# Altium footprint library NXP_60_26022015.PCBLIB: 287 footprints (part 6 of 18)
Each footprint in its own frame and in the unit in brackets; x right, y up, seen from the top. Pads: shape width x height; smd on the part's side, far side on the other; paste and mask are expansions set on the pad; w line width, h text height; cw(c..) or ccw(c..) is an arc to the next point about the centre after c.
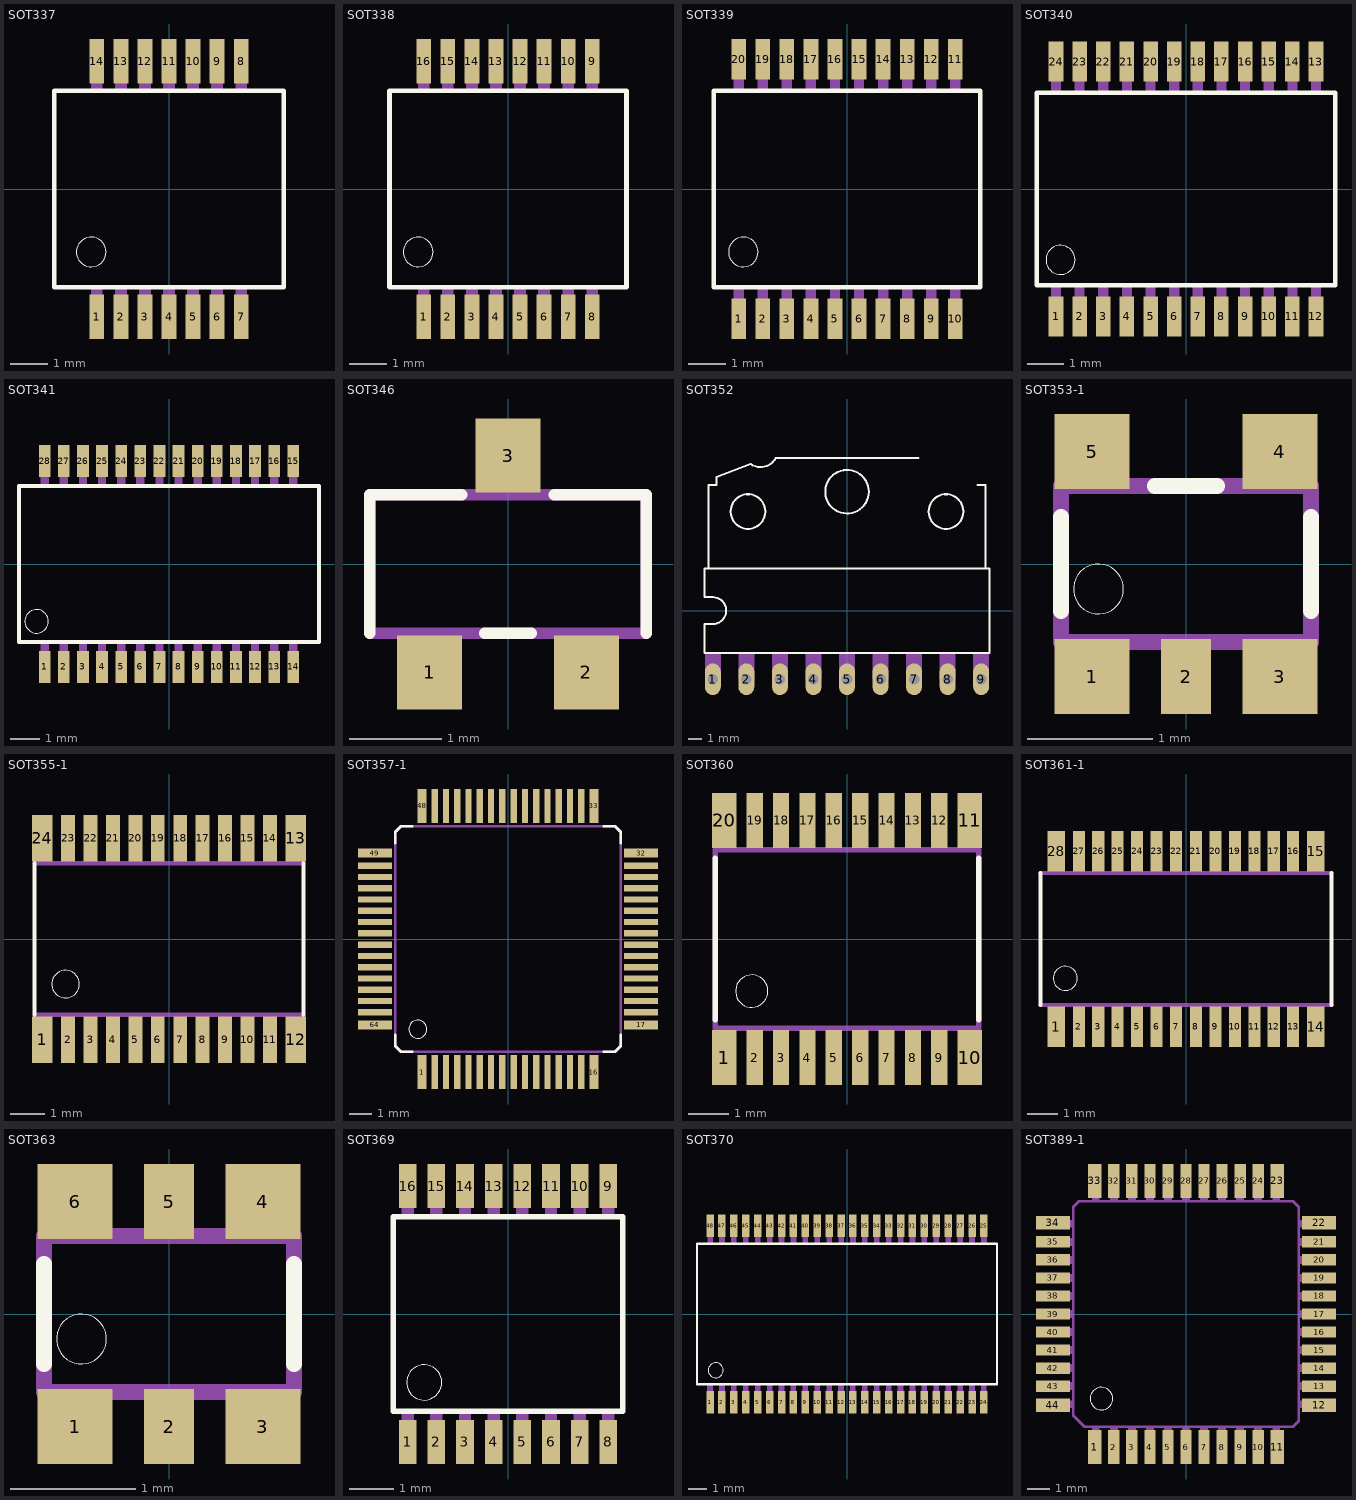
[diagram p5: the footprints below, top view; thin cyan lines are the x and y axes]

## SOT337 [mm]
pads (14):
  rect 0.4x1.2 smd: 1(-1.95,-3.45) 2(-1.3,-3.45) 3(-0.65,-3.45) 4(0,-3.45) 5(0.65,-3.45) 6(1.3,-3.45) 7(1.95,-3.45) 8(1.95,3.45) 9(1.3,3.45) 10(0.65,3.45) 11(0,3.45) 12(-0.65,3.45) 13(-1.3,3.45) 14(-1.95,3.45)
Top Overlay:
  circle w0: c-2.1,-1.7 r0.4
  lines w0.127: -3.1,-2.65 3.1,-2.65 3.1,2.65 -3.1,2.65 -3.1,-2.65
Mechanical 16:
  rectangle: -0.16,2.65 0.16,3.9
  rectangle: 0.49,2.65 0.81,3.9
  rectangle: 1.14,2.65 1.46,3.9
  rectangle: 1.79,2.65 2.11,3.9
  rectangle: -0.81,2.65 -0.49,3.9
  rectangle: -1.46,2.65 -1.14,3.9
  rectangle: -2.11,2.65 -1.79,3.9
  rectangle: -2.11,-3.9 -1.79,-2.65
  rectangle: -1.46,-3.9 -1.14,-2.65
  rectangle: -0.81,-3.9 -0.49,-2.65
  rectangle: -0.16,-3.9 0.16,-2.65
  rectangle: 0.49,-3.9 0.81,-2.65
  rectangle: 1.14,-3.9 1.46,-2.65
  rectangle: 1.79,-3.9 2.11,-2.65

## SOT338 [mm]
pads (16):
  rect 0.4x1.2 smd: 1(-2.275,-3.45) 2(-1.625,-3.45) 3(-0.975,-3.45) 4(-0.325,-3.45) 5(0.325,-3.45) 6(0.975,-3.45) 7(1.625,-3.45) 8(2.275,-3.45) 9(2.275,3.45) 10(1.625,3.45) 11(0.975,3.45) 12(0.325,3.45) 13(-0.325,3.45) 14(-0.975,3.45) 15(-1.625,3.45) 16(-2.275,3.45)
Top Overlay:
  circle w0: c-2.425,-1.7 r0.4
  lines w0.127: -3.2,-2.65 3.2,-2.65 3.2,2.65 -3.2,2.65 -3.2,-2.65
Mechanical 16:
  rectangle: -0.485,2.65 -0.165,3.9
  rectangle: 0.165,2.65 0.485,3.9
  rectangle: 0.815,2.65 1.135,3.9
  rectangle: 1.465,2.65 1.785,3.9
  rectangle: -1.135,2.65 -0.815,3.9
  rectangle: -1.785,2.65 -1.465,3.9
  rectangle: -2.435,2.65 -2.115,3.9
  rectangle: -2.435,-3.9 -2.115,-2.65
  rectangle: -1.785,-3.9 -1.465,-2.65
  rectangle: -1.135,-3.9 -0.815,-2.65
  rectangle: -0.485,-3.9 -0.165,-2.65
  rectangle: 0.165,-3.9 0.485,-2.65
  rectangle: 0.815,-3.9 1.135,-2.65
  rectangle: 1.465,-3.9 1.785,-2.65
  rectangle: 2.115,-3.9 2.435,-2.65
  rectangle: 2.115,2.65 2.435,3.9

## SOT339 [mm]
pads (20):
  rect 0.4x1.1 smd: 1(-2.925,-3.5) 2(-2.275,-3.5) 3(-1.625,-3.5) 4(-0.975,-3.5) 5(-0.325,-3.5) 6(0.325,-3.5) 7(0.975,-3.5) 8(1.625,-3.5) 9(2.275,-3.5) 10(2.925,-3.5) 11(2.925,3.5) 12(2.275,3.5) 13(1.625,3.5) 14(0.975,3.5) 15(0.325,3.5) 16(-0.325,3.5) 17(-0.975,3.5) 18(-1.625,3.5) 19(-2.275,3.5) 20(-2.925,3.5)
Top Overlay:
  circle w0: c-2.8,-1.7 r0.4
  lines w0.127: -3.6,-2.65 3.6,-2.65 3.6,2.65 -3.6,2.65 -3.6,-2.65
Mechanical 16:
  rectangle: -1.115,2.6 -0.835,3.6
  rectangle: -1.765,2.6 -1.485,3.6
  rectangle: -3.065,2.6 -2.785,3.6
  rectangle: -2.415,2.6 -2.135,3.6
  rectangle: 1.485,2.6 1.765,3.6
  rectangle: -0.465,2.6 -0.185,3.6
  rectangle: 0.185,2.6 0.465,3.6
  rectangle: 0.835,2.6 1.115,3.6
  rectangle: 0.835,-3.6 1.115,-2.6
  rectangle: 0.185,-3.6 0.465,-2.6
  rectangle: -0.465,-3.6 -0.185,-2.6
  rectangle: -1.115,-3.6 -0.835,-2.6
  rectangle: -1.765,-3.6 -1.485,-2.6
  rectangle: -2.415,-3.6 -2.135,-2.6
  rectangle: -3.065,-3.6 -2.785,-2.6
  rectangle: 2.785,-3.6 3.065,-2.6
  rectangle: 2.135,2.6 2.415,3.6
  rectangle: 2.785,2.6 3.065,3.6
  rectangle: 1.485,-3.6 1.765,-2.6
  rectangle: 2.135,-3.6 2.415,-2.6

## SOT340 [mm]
pads (24):
  rect 0.4x1.1 smd: 1(-3.575,-3.5) 2(-2.925,-3.5) 3(-2.275,-3.5) 4(-1.625,-3.5) 5(-0.975,-3.5) 6(-0.325,-3.5) 7(0.325,-3.5) 8(0.975,-3.5) 9(1.625,-3.5) 10(2.275,-3.5) 11(2.925,-3.5) 12(3.575,-3.5) 13(3.575,3.5) 14(2.925,3.5) 15(2.275,3.5) 16(1.625,3.5) 17(0.975,3.5) 18(0.325,3.5) 19(-0.325,3.5) 20(-0.975,3.5) 21(-1.625,3.5) 22(-2.275,3.5) 23(-2.925,3.5) 24(-3.575,3.5)
Top Overlay:
  circle w0: c-3.45,-1.95 r0.4
  lines w0.127: -4.1,-2.65 4.1,-2.65 4.1,2.65 -4.1,2.65 -4.1,-2.65
Mechanical 16:
  rectangle: -1.765,2.6 -1.485,3.6
  rectangle: -2.415,2.6 -2.135,3.6
  rectangle: -3.715,2.6 -3.435,3.6
  rectangle: -3.065,2.6 -2.785,3.6
  rectangle: 0.835,2.6 1.115,3.6
  rectangle: -1.115,2.6 -0.835,3.6
  rectangle: -0.465,2.6 -0.185,3.6
  rectangle: 0.185,2.6 0.465,3.6
  rectangle: 0.185,-3.6 0.465,-2.6
  rectangle: -0.465,-3.6 -0.185,-2.6
  rectangle: -1.115,-3.6 -0.835,-2.6
  rectangle: -1.765,-3.6 -1.485,-2.6
  rectangle: -2.415,-3.6 -2.135,-2.6
  rectangle: -3.065,-3.6 -2.785,-2.6
  rectangle: -3.715,-3.6 -3.435,-2.6
  rectangle: 2.135,-3.6 2.415,-2.6
  rectangle: 1.485,2.6 1.765,3.6
  rectangle: 2.135,2.6 2.415,3.6
  rectangle: 0.835,-3.6 1.115,-2.6
  rectangle: 1.485,-3.6 1.765,-2.6
  rectangle: 2.785,2.6 3.065,3.6
  rectangle: 3.435,2.6 3.715,3.6
  rectangle: 2.785,-3.6 3.065,-2.6
  rectangle: 3.435,-3.6 3.715,-2.6

## SOT341 [mm]
pads (28):
  rect 0.4x1.1 smd: 1(-4.225,-3.5) 2(-3.575,-3.5) 3(-2.925,-3.5) 4(-2.275,-3.5) 5(-1.625,-3.5) 6(-0.975,-3.5) 7(-0.325,-3.5) 8(0.325,-3.5) 9(0.975,-3.5) 10(1.625,-3.5) 11(2.275,-3.5) 12(2.925,-3.5) 13(3.575,-3.5) 14(4.225,-3.5) 15(4.225,3.5) 16(3.575,3.5) 17(2.925,3.5) 18(2.275,3.5) 19(1.625,3.5) 20(0.975,3.5) 21(0.325,3.5) 22(-0.325,3.5) 23(-0.975,3.5) 24(-1.625,3.5) 25(-2.275,3.5) 26(-2.925,3.5) 27(-3.575,3.5) 28(-4.225,3.5)
Top Overlay:
  circle w0: c-4.5,-1.95 r0.4
  lines w0.127: -5.1,-2.65 5.1,-2.65 5.1,2.65 -5.1,2.65 -5.1,-2.65
Mechanical 16:
  rectangle: -2.415,2.6 -2.135,3.6
  rectangle: -3.065,2.6 -2.785,3.6
  rectangle: -4.365,2.6 -4.085,3.6
  rectangle: -3.715,2.6 -3.435,3.6
  rectangle: 0.185,2.6 0.465,3.6
  rectangle: -1.765,2.6 -1.485,3.6
  rectangle: -1.115,2.6 -0.835,3.6
  rectangle: -0.465,2.6 -0.185,3.6
  rectangle: -0.465,-3.6 -0.185,-2.6
  rectangle: -1.115,-3.6 -0.835,-2.6
  rectangle: -1.765,-3.6 -1.485,-2.6
  rectangle: -2.415,-3.6 -2.135,-2.6
  rectangle: -3.065,-3.6 -2.785,-2.6
  rectangle: -3.715,-3.6 -3.435,-2.6
  rectangle: -4.365,-3.6 -4.085,-2.6
  rectangle: 1.485,-3.6 1.765,-2.6
  rectangle: 0.835,2.6 1.115,3.6
  rectangle: 1.485,2.6 1.765,3.6
  rectangle: 0.185,-3.6 0.465,-2.6
  rectangle: 0.835,-3.6 1.115,-2.6
  rectangle: 2.135,2.6 2.415,3.6
  rectangle: 2.785,2.6 3.065,3.6
  rectangle: 2.135,-3.6 2.415,-2.6
  rectangle: 2.785,-3.6 3.065,-2.6
  rectangle: 3.435,2.6 3.715,3.6
  rectangle: 4.085,2.6 4.365,3.6
  rectangle: 3.435,-3.6 3.715,-2.6
  rectangle: 4.085,-3.6 4.365,-2.6

## SOT346 [mm]
pads (3):
  rect 0.7x0.8 smd: 1(-0.85,-1.175) 2(0.85,-1.175) 3(0,1.175)
Top Overlay:
  lines w0.125: -1.5,-0.75 -1.5,0.75 -0.5,0.75 ; -0.25,-0.75 0.25,-0.75 ; 0.5,0.75 1.5,0.75 1.5,-0.75
Top Paste:
  rectangle: -0.3,0.825 0.3,1.525
  rectangle: -1.15,-1.525 -0.55,-0.825
  rectangle: 0.55,-1.525 1.15,-0.825
Top Solder:
  rectangle: -0.4,0.725 0.4,1.625
  rectangle: -1.25,-1.625 -0.45,-0.725
  rectangle: 0.45,-1.625 1.25,-0.725
Mechanical 16:
  rectangle: -0.2,0.75 0.2,1.25
  rectangle: -1.05,-1.25 -0.65,-0.75
  rectangle: 0.65,-1.25 1.05,-0.75
  lines w0.125: -1.5,-0.75 1.5,-0.75 1.5,0.75 -1.5,0.75 -1.5,-0.75

## SOT352 [mil]
pads (9):
  oval 47.25x94.5 hole 31.5: 1(-400,-204.72) 2(-300,-204.72) 3(-200,-204.72) 4(-100,-204.72) 5(0,-204.72) 6(100,-204.72) 7(200,-204.72) 8(300,-204.72) 9(400,-204.72)
Top Overlay:
  circle w6: c0,354.33 r64.96
  circle w6: c-295.28,295.28 r51.67
  circle w6: c295.28,295.28 r51.67
  lines w6: 212.6,454.72 -212.6,454.72 cw(c-257.75,478.58) -287.4,437.01 -389.76,397.64 -389.76,374.02 -413.39,374.02 -413.39,125.98 ; 389.76,374.02 413.39,374.02 413.39,125.98 ; -413.39,125.98 413.39,125.98 ; -413.39,125.98 -425.2,125.98 -425.2,40 -400,40 cw(c-400,0) -400,-40 -425.2,-40 -425.2,-125.98 425.2,-125.98 425.2,125.98 413.39,125.98
Bottom Overlay:
  lines w6: 212.6,454.72 ccw(c257.74,478.58) 287.4,437.01 389.76,397.64 389.76,374.02
Mechanical 16:
  rectangle: -23.62,-204.72 23.62,-125.98
  rectangle: -123.62,-204.72 -76.38,-125.98
  rectangle: -223.62,-204.72 -176.38,-125.98
  rectangle: -323.62,-204.72 -276.38,-125.98
  rectangle: -423.62,-204.72 -376.38,-125.98
  rectangle: 76.38,-204.72 123.62,-125.98
  rectangle: 176.38,-204.72 223.62,-125.98
  rectangle: 276.38,-204.72 323.62,-125.98
  rectangle: 376.38,-204.72 423.62,-125.98

## SOT353-1 [mm]
pads (5):
  rect 0.6x0.6 smd: 1(-0.75,-0.9) 3(0.75,-0.9) 4(0.75,0.9) 5(-0.75,0.9)
  rect 0.4x0.6 smd: 2(0,-0.9)
Top Overlay:
  circle w0: c-0.7,-0.2 r0.2
  lines w0.127: -1,-0.375 -1,0.375 ; -0.25,0.625 0.25,0.625 ; 1,-0.375 1,0.375
Mechanical 16:
  rectangle: 0.525,0.625 0.775,0.925
  rectangle: -0.125,-0.925 0.125,-0.625
  rectangle: 0.525,-0.925 0.775,-0.625
  rectangle: -0.775,-0.925 -0.525,-0.625
  rectangle: -0.775,0.625 -0.525,0.925
  lines w0.127: -1,-0.625 -1,0.625 1,0.625 1,-0.625 -1,-0.625

## SOT355-1 [mm]
pads (24):
  rect 0.6x1.35 smd: 1(-3.675,-2.925) 12(3.675,-2.925) 13(3.675,2.925) 24(-3.675,2.925)
  rect 0.4x1.35 smd: 2(-2.925,-2.925) 3(-2.275,-2.925) 4(-1.625,-2.925) 5(-0.975,-2.925) 6(-0.325,-2.925) 7(0.325,-2.925) 8(0.975,-2.925) 9(1.625,-2.925) 10(2.275,-2.925) 11(2.925,-2.925) 14(2.925,2.925) 15(2.275,2.925) 16(1.625,2.925) 17(0.975,2.925) 18(0.325,2.925) 19(-0.325,2.925) 20(-0.975,2.925) 21(-1.625,2.925) 22(-2.275,2.925) 23(-2.925,2.925)
Top Overlay:
  circle w0: c-3,-1.31 r0.4
  lines w0.127: -3.9,-2.2 -3.9,2.2 ; 3.9,-2.2 3.9,2.2
Mechanical 16:
  rectangle: -0.45,2.2 -0.2,3.2
  rectangle: -1.1,2.2 -0.85,3.2
  rectangle: -1.75,2.2 -1.5,3.2
  rectangle: -2.4,2.2 -2.15,3.2
  rectangle: -3.05,2.2 -2.8,3.2
  rectangle: -3.7,2.2 -3.45,3.2
  rectangle: 0.2,2.2 0.45,3.2
  rectangle: 0.85,2.2 1.1,3.2
  rectangle: 1.5,2.2 1.75,3.2
  rectangle: 2.15,2.2 2.4,3.2
  rectangle: 2.8,2.2 3.05,3.2
  rectangle: 3.45,2.2 3.7,3.2
  rectangle: -0.45,-3.2 -0.2,-2.2
  rectangle: -1.1,-3.2 -0.85,-2.2
  rectangle: -1.75,-3.2 -1.5,-2.2
  rectangle: -2.4,-3.2 -2.15,-2.2
  rectangle: -3.05,-3.2 -2.8,-2.2
  rectangle: -3.7,-3.2 -3.45,-2.2
  rectangle: 0.2,-3.2 0.45,-2.2
  rectangle: 0.85,-3.2 1.1,-2.2
  rectangle: 1.5,-3.2 1.75,-2.2
  rectangle: 2.15,-3.2 2.4,-2.2
  rectangle: 2.8,-3.2 3.05,-2.2
  rectangle: 3.45,-3.2 3.7,-2.2
  lines w0.127: -3.9,-2.2 3.9,-2.2 ; -3.9,2.2 3.9,2.2

## SOT357-1 [mm]
pads (64):
  rect 0.4x1.5 smd: 1(-3.81,-5.9) 16(3.81,-5.9) 33(3.81,5.9) 48(-3.81,5.9)
  rect 0.28x1.5 smd: 2(-3.25,-5.9) 3(-2.75,-5.9) 4(-2.25,-5.9) 5(-1.75,-5.9) 6(-1.25,-5.9) 7(-0.75,-5.9) 8(-0.25,-5.9) 9(0.25,-5.9) 10(0.75,-5.9) 11(1.25,-5.9) 12(1.75,-5.9) 13(2.25,-5.9) 14(2.75,-5.9) 15(3.25,-5.9) 34(3.25,5.9) 35(2.75,5.9) 36(2.25,5.9) 37(1.75,5.9) 38(1.25,5.9) 39(0.75,5.9) 40(0.25,5.9) 41(-0.25,5.9) 42(-0.75,5.9) 43(-1.25,5.9) 44(-1.75,5.9) 45(-2.25,5.9) 46(-2.75,5.9) 47(-3.25,5.9)
  rect 1.5x0.4 smd: 17(5.9,-3.81) 32(5.9,3.81) 49(-5.9,3.81) 64(-5.9,-3.81)
  rect 1.5x0.28 smd: 18(5.9,-3.25) 19(5.9,-2.75) 20(5.9,-2.25) 21(5.9,-1.75) 22(5.9,-1.25) 23(5.9,-0.75) 24(5.9,-0.25) 25(5.9,0.25) 26(5.9,0.75) 27(5.9,1.25) 28(5.9,1.75) 29(5.9,2.25) 30(5.9,2.75) 31(5.9,3.25) 50(-5.9,3.25) 51(-5.9,2.75) 52(-5.9,2.25) 53(-5.9,1.75) 54(-5.9,1.25) 55(-5.9,0.75) 56(-5.9,0.25) 57(-5.9,-0.25) 58(-5.9,-0.75) 59(-5.9,-1.25) 60(-5.9,-1.75) 61(-5.9,-2.25) 62(-5.9,-2.75) 63(-5.9,-3.25)
Top Overlay:
  circle w0: c-4,-4 r0.4
  lines w0.127: -5,-4.25 -5,-4.75 -4.75,-5 -4.25,-5 ; -5,4.25 -5,4.75 -4.75,5 -4.25,5 ; 4.25,-5 4.75,-5 5,-4.75 5,-4.25 ; 4.25,5 4.75,5 5,4.75 5,4.25
Mechanical 16:
  lines w0.127: -5,-4.75 -5,4.75 -4.75,5 4.75,5 5,4.75 5,-4.75 4.75,-5 -4.75,-5 -5,-4.75
  text "SOT357-1" at -0.75,-3.375 h0.17

## SOT360 [mm]
pads (20):
  rect 0.6x1.35 smd: 1(-3.025,-2.925) 10(3.025,-2.925) 11(3.025,2.925) 20(-3.025,2.925)
  rect 0.4x1.35 smd: 2(-2.275,-2.925) 3(-1.625,-2.925) 4(-0.975,-2.925) 5(-0.325,-2.925) 6(0.325,-2.925) 7(0.975,-2.925) 8(1.625,-2.925) 9(2.275,-2.925) 12(2.275,2.925) 13(1.625,2.925) 14(0.975,2.925) 15(0.325,2.925) 16(-0.325,2.925) 17(-0.975,2.925) 18(-1.625,2.925) 19(-2.275,2.925)
Top Overlay:
  circle w0: c-2.35,-1.285 r0.4
  lines w0.127: -3.25,-2 -3.25,2 ; 3.25,-2 3.25,2
Mechanical 16:
  rectangle: 0.2,2.2 0.45,3.2
  rectangle: -0.45,2.2 -0.2,3.2
  rectangle: -1.1,2.2 -0.85,3.2
  rectangle: -1.75,2.2 -1.5,3.2
  rectangle: -2.4,2.2 -2.15,3.2
  rectangle: -3.05,2.2 -2.8,3.2
  rectangle: 0.85,2.2 1.1,3.2
  rectangle: 1.5,2.2 1.75,3.2
  rectangle: 2.15,2.2 2.4,3.2
  rectangle: 2.8,2.2 3.05,3.2
  rectangle: -3.05,-3.2 -2.8,-2.2
  rectangle: -2.4,-3.2 -2.15,-2.2
  rectangle: -1.75,-3.2 -1.5,-2.2
  rectangle: -1.1,-3.2 -0.85,-2.2
  rectangle: -0.45,-3.2 -0.2,-2.2
  rectangle: 0.2,-3.2 0.45,-2.2
  rectangle: 0.85,-3.2 1.1,-2.2
  rectangle: 1.5,-3.2 1.75,-2.2
  rectangle: 2.15,-3.2 2.4,-2.2
  rectangle: 2.8,-3.2 3.05,-2.2
  lines w0.127: -3.25,-2.2 3.25,-2.2 3.25,2.2 -3.25,2.2 -3.25,-2.2

## SOT361-1 [mm]
pads (28):
  rect 0.6x1.35 smd: 1(-4.325,-2.925) 14(4.325,-2.925) 15(4.325,2.925) 28(-4.325,2.925)
  rect 0.4x1.35 smd: 2(-3.575,-2.925) 3(-2.925,-2.925) 4(-2.275,-2.925) 5(-1.625,-2.925) 6(-0.975,-2.925) 7(-0.325,-2.925) 8(0.325,-2.925) 9(0.975,-2.925) 10(1.625,-2.925) 11(2.275,-2.925) 12(2.925,-2.925) 13(3.575,-2.925) 16(3.575,2.925) 17(2.925,2.925) 18(2.275,2.925) 19(1.625,2.925) 20(0.975,2.925) 21(0.325,2.925) 22(-0.325,2.925) 23(-0.975,2.925) 24(-1.625,2.925) 25(-2.275,2.925) 26(-2.925,2.925) 27(-3.575,2.925)
Top Overlay:
  circle w0: c-4.025,-1.31 r0.4
  lines w0.127: -4.85,-2.2 -4.85,2.2 ; 4.85,-2.2 4.85,2.2
Mechanical 16:
  rectangle: -0.45,2.2 -0.2,3.2
  rectangle: -1.1,2.2 -0.85,3.2
  rectangle: -1.75,2.2 -1.5,3.2
  rectangle: -2.4,2.2 -2.15,3.2
  rectangle: -3.05,2.2 -2.8,3.2
  rectangle: -3.7,2.2 -3.45,3.2
  rectangle: -4.35,2.2 -4.1,3.2
  rectangle: 0.2,2.2 0.45,3.2
  rectangle: 0.85,2.2 1.1,3.2
  rectangle: 1.5,2.2 1.75,3.2
  rectangle: 2.15,2.2 2.4,3.2
  rectangle: 2.8,2.2 3.05,3.2
  rectangle: 3.45,2.2 3.7,3.2
  rectangle: 4.1,2.2 4.35,3.2
  rectangle: -0.45,-3.2 -0.2,-2.2
  rectangle: -1.1,-3.2 -0.85,-2.2
  rectangle: -1.75,-3.2 -1.5,-2.2
  rectangle: -2.4,-3.2 -2.15,-2.2
  rectangle: -3.05,-3.2 -2.8,-2.2
  rectangle: -3.7,-3.2 -3.45,-2.2
  rectangle: -4.35,-3.2 -4.1,-2.2
  rectangle: 0.2,-3.2 0.45,-2.2
  rectangle: 0.85,-3.2 1.1,-2.2
  rectangle: 1.5,-3.2 1.75,-2.2
  rectangle: 2.15,-3.2 2.4,-2.2
  rectangle: 2.8,-3.2 3.05,-2.2
  rectangle: 3.45,-3.2 3.7,-2.2
  rectangle: 4.1,-3.2 4.35,-2.2
  lines w0.127: -4.85,-2.2 4.85,-2.2 ; -4.85,2.2 4.85,2.2

## SOT363 [mm]
pads (6):
  rect 0.6x0.6 smd: 1(-0.75,-0.9) 3(0.75,-0.9) 4(0.75,0.9) 6(-0.75,0.9)
  rect 0.4x0.6 smd: 2(0,-0.9) 5(0,0.9)
Top Overlay:
  circle w0: c-0.7,-0.2 r0.2
  lines w0.127: -1,-0.4 -1,0.4 ; 1,-0.4 1,0.4
Mechanical 16:
  rectangle: -0.125,0.625 0.125,0.925
  rectangle: 0.525,0.625 0.775,0.925
  rectangle: -0.125,-0.925 0.125,-0.625
  rectangle: 0.525,-0.925 0.775,-0.625
  rectangle: -0.775,-0.925 -0.525,-0.625
  rectangle: -0.775,0.625 -0.525,0.925
  lines w0.127: -1,-0.625 -1,0.625 1,0.625 1,-0.625 -1,-0.625

## SOT369 [mm]
pads (16):
  rect 0.4x1 smd: 1(-2.275,-2.9) 2(-1.625,-2.9) 3(-0.975,-2.9) 4(-0.325,-2.9) 5(0.325,-2.9) 6(0.975,-2.9) 7(1.625,-2.9) 8(2.275,-2.9) 9(2.275,2.9) 10(1.625,2.9) 11(0.975,2.9) 12(0.325,2.9) 13(-0.325,2.9) 14(-0.975,2.9) 15(-1.625,2.9) 16(-2.275,2.9)
Top Overlay:
  circle w0: c-1.9,-1.55 r0.4
  lines w0.127: -2.6,-2.2 2.6,-2.2 2.6,2.2 -2.6,2.2 -2.6,-2.2
Mechanical 16:
  rectangle: 0.185,2.2 0.465,3.2
  rectangle: -0.465,2.2 -0.185,3.2
  rectangle: -1.765,2.2 -1.485,3.2
  rectangle: -1.115,2.2 -0.835,3.2
  rectangle: -2.415,2.2 -2.135,3.2
  rectangle: 0.835,2.2 1.115,3.2
  rectangle: 1.485,2.2 1.765,3.2
  rectangle: 2.135,2.2 2.415,3.2
  rectangle: 2.135,-3.2 2.415,-2.2
  rectangle: 1.485,-3.2 1.765,-2.2
  rectangle: 0.835,-3.2 1.115,-2.2
  rectangle: 0.185,-3.2 0.465,-2.2
  rectangle: -0.465,-3.2 -0.185,-2.2
  rectangle: -1.115,-3.2 -0.835,-2.2
  rectangle: -1.765,-3.2 -1.485,-2.2
  rectangle: -2.415,-3.2 -2.135,-2.2

## SOT370 [mm]
pads (48):
  rect 0.4x1.2 smd: 1(-7.302,-4.7) 2(-6.667,-4.7) 3(-6.032,-4.7) 4(-5.397,-4.7) 5(-4.763,-4.7) 6(-4.127,-4.7) 7(-3.492,-4.7) 8(-2.857,-4.7) 9(-2.222,-4.7) 10(-1.587,-4.7) 11(-0.953,-4.7) 12(-0.318,-4.7) 13(0.318,-4.7) 14(0.953,-4.7) 15(1.587,-4.7) 16(2.222,-4.7) 17(2.857,-4.7) 18(3.492,-4.7) 19(4.127,-4.7) 20(4.763,-4.7) 21(5.397,-4.7) 22(6.032,-4.7) 23(6.667,-4.7) 24(7.302,-4.7) 25(7.302,4.7) 26(6.667,4.7) 27(6.032,4.7) 28(5.397,4.7) 29(4.763,4.7) 30(4.127,4.7) 31(3.492,4.7) 32(2.857,4.7) 33(2.222,4.7) 34(1.587,4.7) 35(0.953,4.7) 36(0.318,4.7) 37(-0.318,4.7) 38(-0.953,4.7) 39(-1.587,4.7) 40(-2.222,4.7) 41(-2.857,4.7) 42(-3.492,4.7) 43(-4.127,4.7) 44(-4.763,4.7) 45(-5.397,4.7) 46(-6.032,4.7) 47(-6.667,4.7) 48(-7.302,4.7)
Top Overlay:
  circle w0: c-7,-3 r0.4
  lines w0.127: -8,-3.75 8,-3.75 8,-3.115 8,3.75 -8,3.75 -8,-3.75
Mechanical 16:
  rectangle: -3.645,-5.15 -3.345,-3.75
  region: -3.34,5.15 -3.64,5.15 -3.64,3.75 -3.34,3.75
  rectangle: -4.28,-5.15 -3.98,-3.75
  rectangle: -4.915,-5.15 -4.615,-3.75
  rectangle: -5.55,-5.15 -5.25,-3.75
  rectangle: -6.185,-5.15 -5.885,-3.75
  rectangle: -6.82,-5.15 -6.52,-3.75
  rectangle: -7.455,-5.15 -7.155,-3.75
  rectangle: -3.01,-5.15 -2.71,-3.75
  rectangle: -2.375,-5.15 -2.075,-3.75
  rectangle: -1.74,-5.15 -1.44,-3.75
  rectangle: -1.105,-5.15 -0.805,-3.75
  rectangle: -0.47,-5.15 -0.17,-3.75
  rectangle: -0.47,-5.15 -0.17,-3.75
  rectangle: 0.165,-5.15 0.465,-3.75
  rectangle: 0.165,-5.15 0.465,-3.75
  rectangle: 0.8,-5.15 1.1,-3.75
  rectangle: 0.8,-5.15 1.1,-3.75
  rectangle: 1.435,-5.15 1.735,-3.75
  rectangle: 2.07,-5.15 2.37,-3.75
  rectangle: 2.705,-5.15 3.005,-3.75
  rectangle: 3.34,-5.15 3.64,-3.75
  rectangle: 3.975,-5.15 4.275,-3.75
  rectangle: 4.61,-5.15 4.91,-3.75
  rectangle: 5.245,-5.15 5.545,-3.75
  rectangle: 5.88,-5.15 6.18,-3.75
  rectangle: 6.515,-5.15 6.815,-3.75
  rectangle: 7.15,-5.15 7.45,-3.75
  region: -3.975,5.15 -4.275,5.15 -4.275,3.75 -3.975,3.75
  region: -4.61,5.15 -4.91,5.15 -4.91,3.75 -4.61,3.75
  region: -5.245,5.15 -5.545,5.15 -5.545,3.75 -5.245,3.75
  region: -5.88,5.15 -6.18,5.15 -6.18,3.75 -5.88,3.75
  region: -7.15,5.15 -7.45,5.15 -7.45,3.75 -7.15,3.75
  region: -6.515,5.15 -6.815,5.15 -6.815,3.75 -6.515,3.75
  region: 1.105,5.15 0.805,5.15 0.805,3.75 1.105,3.75
  region: 0.47,5.15 0.17,5.15 0.17,3.75 0.47,3.75
  region: -0.165,5.15 -0.465,5.15 -0.465,3.75 -0.165,3.75
  region: -0.8,5.15 -1.1,5.15 -1.1,3.75 -0.8,3.75
  region: -1.435,5.15 -1.735,5.15 -1.735,3.75 -1.435,3.75
  region: -2.705,5.15 -3.005,5.15 -3.005,3.75 -2.705,3.75
  region: -2.07,5.15 -2.37,5.15 -2.37,3.75 -2.07,3.75
  region: 5.55,5.15 5.25,5.15 5.25,3.75 5.55,3.75
  region: 4.915,5.15 4.615,5.15 4.615,3.75 4.915,3.75
  region: 4.28,5.15 3.98,5.15 3.98,3.75 4.28,3.75
  region: 3.645,5.15 3.345,5.15 3.345,3.75 3.645,3.75
  region: 3.01,5.15 2.71,5.15 2.71,3.75 3.01,3.75
  region: 1.74,5.15 1.44,5.15 1.44,3.75 1.74,3.75
  region: 2.375,5.15 2.075,5.15 2.075,3.75 2.375,3.75
  region: 6.185,5.15 5.885,5.15 5.885,3.75 6.185,3.75
  region: 6.82,5.15 6.52,5.15 6.52,3.75 6.82,3.75
  region: 7.455,5.15 7.155,5.15 7.155,3.75 7.455,3.75

## SOT389-1 [mil]
pads (44):
  rect 23.62x59.06 smd: 1(-159.45,-232.28) 11(159.45,-232.28) 23(159.45,232.28) 33(-159.45,232.28)
  rect 19.69x59.06 smd: 2(-125.98,-232.28) 3(-94.49,-232.28) 4(-62.99,-232.28) 5(-31.5,-232.28) 6(0,-232.28) 7(31.5,-232.28) 8(62.99,-232.28) 9(94.49,-232.28) 10(125.98,-232.28) 24(125.98,232.28) 25(94.49,232.28) 26(62.99,232.28) 27(31.5,232.28) 28(0,232.28) 29(-31.5,232.28) 30(-62.99,232.28) 31(-94.49,232.28) 32(-125.98,232.28)
  rect 59.06x23.62 smd: 12(232.28,-159.45) 22(232.28,159.45) 34(-232.28,159.45) 44(-232.28,-159.45)
  rect 59.06x19.69 smd: 13(232.28,-125.98) 14(232.28,-94.49) 15(232.28,-62.99) 16(232.28,-31.5) 17(232.28,0) 18(232.28,31.5) 19(232.28,62.99) 20(232.28,94.49) 21(232.28,125.98) 35(-232.28,125.98) 36(-232.28,94.49) 37(-232.28,62.99) 38(-232.28,31.5) 39(-232.28,0) 40(-232.28,-31.5) 41(-232.28,-62.99) 42(-232.28,-94.49) 43(-232.28,-125.98)
Top Overlay:
  circle w0: c-147.64,-147.64 r19.69
Mechanical 16:
  rectangle: -6.89,-236.22 6.89,-196.85
  rectangle: -38.39,-236.22 -24.61,-196.85
  rectangle: -69.88,-236.22 -56.1,-196.85
  rectangle: -101.38,-236.22 -87.6,-196.85
  rectangle: -132.87,-236.22 -119.09,-196.85
  rectangle: -164.37,-236.22 -150.59,-196.85
  rectangle: 24.61,-236.22 38.39,-196.85
  rectangle: 56.1,-236.22 69.88,-196.85
  rectangle: 87.6,-236.22 101.38,-196.85
  rectangle: 119.09,-236.22 132.87,-196.85
  rectangle: 150.59,-236.22 164.37,-196.85
  region: 6.89,236.22 -6.89,236.22 -6.89,196.85 6.89,196.85
  region: -24.61,236.22 -38.39,236.22 -38.39,196.85 -24.61,196.85
  region: -56.1,236.22 -69.88,236.22 -69.88,196.85 -56.1,196.85
  region: -87.6,236.22 -101.38,236.22 -101.38,196.85 -87.6,196.85
  region: -119.09,236.22 -132.87,236.22 -132.87,196.85 -119.09,196.85
  region: -150.59,236.22 -164.37,236.22 -164.37,196.85 -150.59,196.85
  region: 38.39,236.22 24.61,236.22 24.61,196.85 38.39,196.85
  region: 69.88,236.22 56.1,236.22 56.1,196.85 69.88,196.85
  region: 101.38,236.22 87.6,236.22 87.6,196.85 101.38,196.85
  region: 132.87,236.22 119.09,236.22 119.09,196.85 132.87,196.85
  region: 164.37,236.22 150.59,236.22 150.59,196.85 164.37,196.85
  rectangle: -236.22,-6.89 -196.85,6.89
  rectangle: -236.22,-38.39 -196.85,-24.61
  rectangle: -236.22,-69.88 -196.85,-56.1
  rectangle: -236.22,-101.38 -196.85,-87.6
  rectangle: -236.22,-132.87 -196.85,-119.09
  rectangle: -236.22,-164.37 -196.85,-150.59
  rectangle: -236.22,24.61 -196.85,38.39
  rectangle: -236.22,56.1 -196.85,69.88
  rectangle: -236.22,87.6 -196.85,101.38
  rectangle: -236.22,119.09 -196.85,132.87
  rectangle: -236.22,150.59 -196.85,164.37
  region: 236.22,6.89 196.85,6.89 196.85,-6.89 236.22,-6.89
  region: 236.22,38.39 196.85,38.39 196.85,24.61 236.22,24.61
  region: 236.22,69.88 196.85,69.88 196.85,56.1 236.22,56.1
  region: 236.22,101.38 196.85,101.38 196.85,87.6 236.22,87.6
  region: 236.22,132.87 196.85,132.87 196.85,119.09 236.22,119.09
  region: 236.22,164.37 196.85,164.37 196.85,150.59 236.22,150.59
  region: 236.22,-24.61 196.85,-24.61 196.85,-38.39 236.22,-38.39
  region: 236.22,-56.1 196.85,-56.1 196.85,-69.88 236.22,-69.88
  region: 236.22,-87.6 196.85,-87.6 196.85,-101.38 236.22,-101.38
  region: 236.22,-119.09 196.85,-119.09 196.85,-132.87 236.22,-132.87
  region: 236.22,-150.59 196.85,-150.59 196.85,-164.37 236.22,-164.37
  lines w5: -196.85,-177.17 -196.85,187.01 -187.01,196.85 187.01,196.85 196.85,187.01 196.85,-187.01 187.01,-196.85 -177.17,-196.85 -196.85,-177.17